# Altium footprint library 我的封装库.PcbLib: 90 footprints (part 6 of 6)
Each footprint in its own frame and in the unit in brackets; x right, y up, seen from the top. Pads: shape width x height; smd on the part's side, far side on the other; paste and mask are expansions set on the pad; w line width, h text height; cw(c..) or ccw(c..) is an arc to the next point about the centre after c.
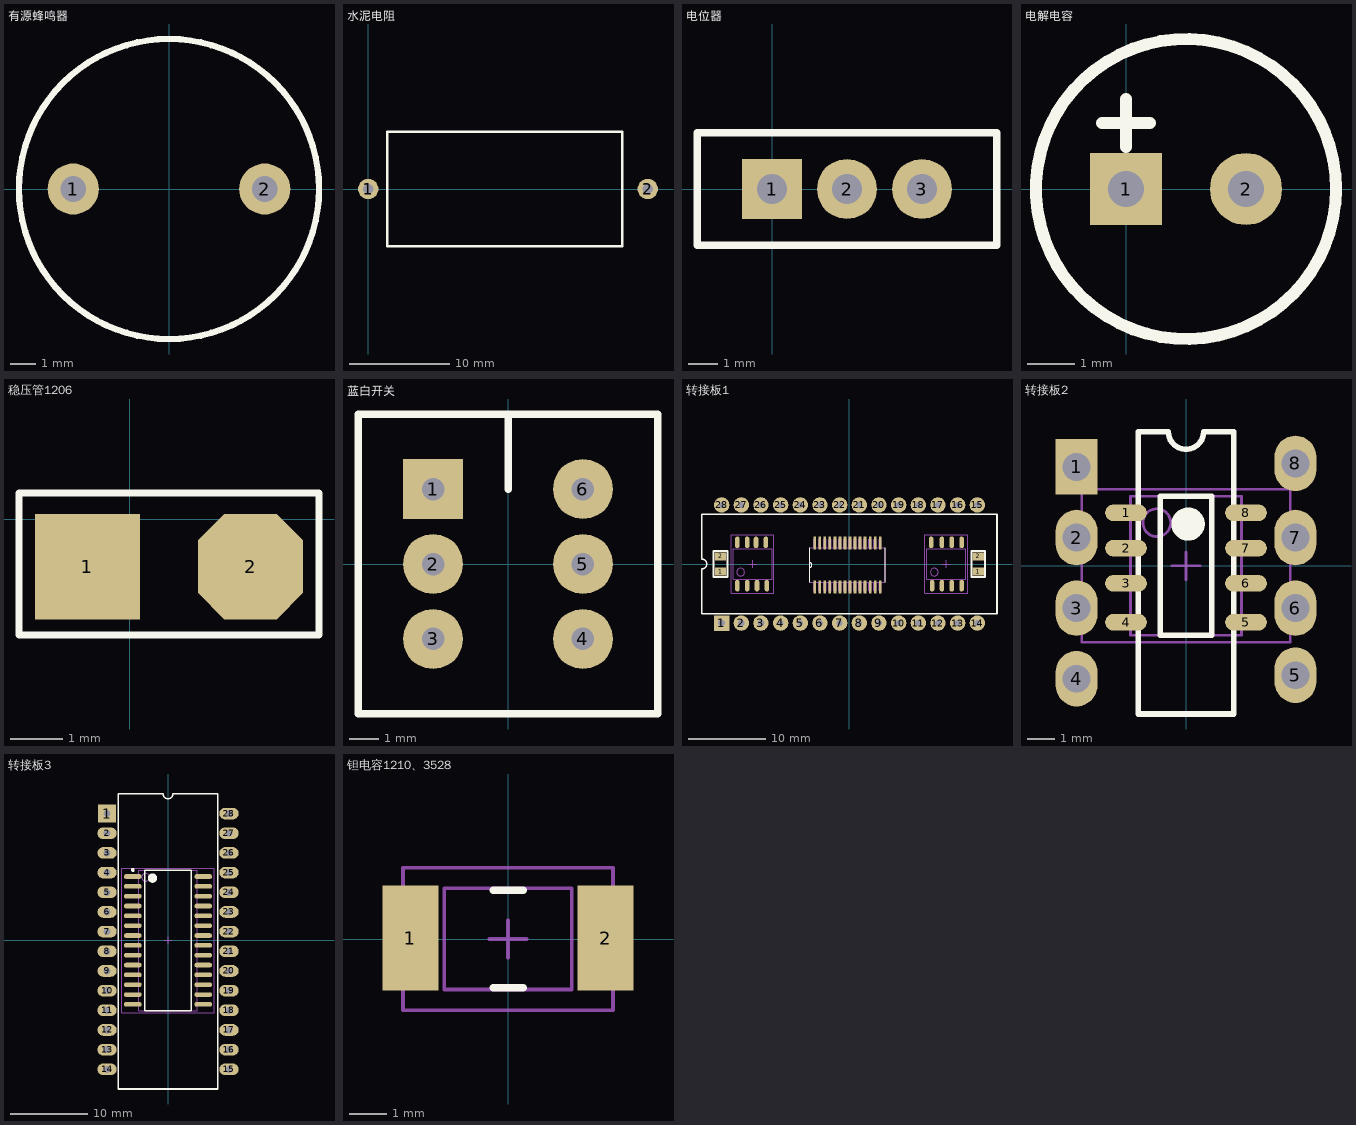
[diagram p5: the footprints below, top view; thin cyan lines are the x and y axes]

## 有源蜂鸣器 [mil]
pads (2):
  round 80 hole 40: 1(-150,0) 2(150,0)
Top Overlay:
  circle w10: c0,0 r235

## 水泥电阻 [mil]
pads (2):
  round 80 hole 40: 1(0,0) 2(1100,0)
Top Overlay:
  lines w10: 75,-225 1000,-225 1000,225 75,225 75,-225

## 电位器 [mil]
pads (3):
  rect 80x80 hole 40: 1(0,0)
  round 80 hole 40: 2(100,0) 3(200,0)
Top Overlay:
  lines w10: -100,-75 -100,75 300,75 300,-75 -100,-75

## 电解电容 [mil]
pads (2):
  rect 60x60 hole 30: 1(0,0)
  round 60 hole 30: 2(100,0)
Top Overlay:
  circle w10: c50,0 r125
  lines w10: -20,55 20,55 ; 0,35 0,75

## 稳压管1206 [mm]
pads (2):
  rect 2x2 smd: 1(-0.8,-0.9)
  oct 2x2 smd: 2(2.3,-0.9)
Top Overlay:
  lines w0.127: -2.1,-2.2 -2.1,0.5 3.6,0.5 3.6,-2.2 -2.1,-2.2

## 蓝白开关 [mil]
pads (6):
  rect 80x80 hole 30: 1(-100,100)
  round 80 hole 30: 2(-100,0) 3(-100,-100) 4(100,-100) 5(100,0) 6(100,100)
Top Overlay:
  lines w10: 0,100 0,200 ; -200,-200 -200,200 200,200 200,-200 -200,-200

## 转接板1 [mil]
pads (76):
  rect 57.09x41.34 smd: 1(-655,-38.39) 1(655,-38.39) 2(-655,38.39) 2(655,38.39)
  rect 78.74x78.74 hole 35.43: 1(-650,-300)
  oval 23.62x59.06 smd: 1(-570,-110) 1(420,-110) 2(-520,-110) 2(470,-110) 3(-470,-110) 3(520,-110) 4(-420,-110) 4(570,-110) 5(-425,110) 5(570,110) 6(-475,110) 6(520,110) 7(-520,110) 7(470,110) 8(-570,110) 8(415,110)
  rect 14x66 smd: 1(-176.34,-116) 2(-150.75,-116) 3(-125.16,-116) 4(-99.57,-116) 5(-73.98,-116) 6(-48.39,-116) 7(-22.8,-116) 8(2.8,-116) 9(28.39,-116) 10(53.98,-116) 11(79.57,-116) 12(105.16,-116) 13(130.75,-116) 14(156.34,-116) 15(156.34,106) 16(130.75,106) 17(105.16,106) 18(79.57,106) 19(53.98,106) 20(28.39,106) 21(2.8,106) 22(-22.8,106) 23(-48.39,106) 24(-73.98,106) 25(-99.57,106) 26(-125.16,106) 27(-150.75,106) 28(-176.34,106)
  round 78.74 hole 35.43: 2(-550,-300) 3(-450,-300)
  round 78.74 hole 30: 4(-350,-300) 5(-250,-300) 6(-150,-300) 7(-50,-300) 8(50,-300) 9(150,-300) 10(250,-300) 11(350,-300) 12(450,-300) 13(550,-300) 14(650,-300) 15(650,300) 16(550,300) 17(450,300) 18(350,300) 19(250,300) 20(150,300) 21(50,300) 22(-50,300) 23(-150,300) 24(-250,300) 25(-350,300) 26(-450,300) 27(-550,300) 28(-650,300)
Top Overlay:
  lines w6: -203,-93.5 -203,83.5 ; -203,-17 ccw(c-203,-5) -203,7 ; 183,-93.5 183,83.5
  lines w7.87: -750,-253.94 750,-253.94 750,253.94 -750,253.94 -750,25 cw(c-750,0) -750,-25 -750,-253.94
  lines w10: -690,-65 -620,-65 -620,65 -690,65 -690,-65 ; 620,-65 690,-65 690,65 620,65 620,-65
Mechanical 1:
  lines w0: -203,-17 ccw(c-203,-5) -203,7 ; -203,-93.5 183,-93.5 183,83.5 -203,83.5 -203,-93.5 ; -182.34,-135 -170.34,-135 -170.34,-93.5 -182.34,-93.5 -182.34,-135 ; -182.34,83.5 -182.34,125 -170.34,125 -170.34,83.5 -182.34,83.5 ; -156.75,-135 -144.75,-135 -144.75,-93.5 -156.75,-93.5 -156.75,-135 ; -156.75,83.5 -156.75,125 -144.75,125 -144.75,83.5 -156.75,83.5 ; -131.16,-135 -119.16,-135 -119.16,-93.5 -131.16,-93.5 -131.16,-135 ; -131.16,83.5 -131.16,125 -119.16,125 -119.16,83.5 -131.16,83.5 ; -105.57,-135 -93.57,-135 -93.57,-93.5 -105.57,-93.5 -105.57,-135 ; -105.57,83.5 -105.57,125 -93.57,125 -93.57,83.5 -105.57,83.5 ; -79.98,-135 -67.98,-135 -67.98,-93.5 -79.98,-93.5 -79.98,-135 ; -79.98,83.5 -79.98,125 -67.98,125 -67.98,83.5 -79.98,83.5 ; -54.39,-135 -42.39,-135 -42.39,-93.5 -54.39,-93.5 -54.39,-135 ; -54.39,83.5 -54.39,125 -42.39,125 -42.39,83.5 -54.39,83.5 ; -28.8,-135 -16.8,-135 -16.8,-93.5 -28.8,-93.5 -28.8,-135 ; -28.8,83.5 -28.8,125 -16.8,125 -16.8,83.5 -28.8,83.5 ; -3.2,-135 8.8,-135 8.8,-93.5 -3.2,-93.5 -3.2,-135 ; -3.2,83.5 -3.2,125 8.8,125 8.8,83.5 -3.2,83.5 ; 22.39,-135 34.39,-135 34.39,-93.5 22.39,-93.5 22.39,-135 ; 22.39,83.5 22.39,125 34.39,125 34.39,83.5 22.39,83.5 ; 47.98,-135 59.98,-135 59.98,-93.5 47.98,-93.5 47.98,-135 ; 47.98,83.5 47.98,125 59.98,125 59.98,83.5 47.98,83.5 ; 73.57,-135 85.57,-135 85.57,-93.5 73.57,-93.5 73.57,-135 ; 73.57,83.5 73.57,125 85.57,125 85.57,83.5 73.57,83.5 ; 99.16,-135 111.16,-135 111.16,-93.5 99.16,-93.5 99.16,-135 ; 99.16,83.5 99.16,125 111.16,125 111.16,83.5 99.16,83.5 ; 124.75,-135 136.75,-135 136.75,-93.5 124.75,-93.5 124.75,-135 ; 124.75,83.5 124.75,125 136.75,125 136.75,83.5 124.75,83.5 ; 150.34,-135 162.34,-135 162.34,-93.5 150.34,-93.5 150.34,-135 ; 150.34,83.5 150.34,125 162.34,125 162.34,83.5 150.34,83.5
Mechanical 13:
  circle w3.94: c431.1,-41.34 r19.68
  circle w3.94: c-553.15,-41.34 r19.68
  lines w3.94: -682.56,-43.31 -627.44,-43.31 ; -682.56,43.31 -627.44,43.31 ; 627.44,-43.31 682.56,-43.31 ; 627.44,43.31 682.56,43.31 ; -590.55,-78.74 -590.55,78.74 -393.7,78.74 -393.7,-78.74 -590.55,-78.74 ; 393.7,-78.74 393.7,78.74 590.55,78.74 590.55,-78.74 393.7,-78.74
Mechanical 15:
  lines w3.94: -511.81,0 -472.44,0 ; -492.13,-19.68 -492.13,19.69 ; 472.44,0 511.81,0 ; 492.13,-19.68 492.13,19.69 ; -600.39,-147.64 -600.39,147.64 -383.86,147.64 -383.86,-147.64 -600.39,-147.64 ; 383.86,-147.64 383.86,147.64 600.39,147.64 600.39,-147.64 383.86,-147.64
Drill Drawing:
  drawing of 166 lines, arcs and shapes, not listed
3D body: height 68.9, standoff 7.48, extent 393.7,-78.74 590.55,78.74
3D body: height 68.9, standoff 7.48, extent -590.55,-78.74 -393.7,78.74

## 转接板2 [mm]
pads (16):
  rect 1.5x2 hole 1: 1(-3.937,3.556)
  oval 1.5x0.6 smd: 1(-2.159,1.905) 2(-2.159,0.635) 3(-2.159,-0.635) 4(-2.159,-2.032) 5(2.159,-2.032) 6(2.159,-0.635) 7(2.159,0.635) 8(2.159,1.905)
  oval 1.5x2 hole 1: 2(-3.937,1.016) 3(-3.937,-1.524) 4(-3.937,-4.064) 5(3.937,-3.937) 6(3.937,-1.524) 7(3.937,1.016) 8(3.937,3.683)
Top Overlay:
  circle w0.6: c0.075,1.5 r0.3
  lines w0.2: -1.725,-5.334 -1.725,4.826 -0.635,4.826 ccw(c0,4.826) 0.635,4.826 1.725,4.826 1.725,-5.334 -1.725,-5.334 ; -0.925,-2.5 -0.925,2.5 0.925,2.5 0.925,-2.5 -0.925,-2.5
Mechanical 13:
  circle w0.1: c-1.05,1.55 r0.5
  lines w0.1: -2,-2.5 -2,2.5 2,2.5 2,-2.5 -2,-2.5
Mechanical 15:
  lines w0.1: -0.5,0 0.5,0 ; 0,-0.5 0,0.5 ; -3.75,-2.75 -3.75,2.75 3.75,2.75 3.75,-2.75 -3.75,-2.75
Drill Drawing:
  lines w0.254: -4.191,-3.683 -2.667,-2.159 -2.667,-2.032 ; -4.064,3.556 -3.81,3.556 ; -3.556,-1.397 -2.794,-0.635 ; -3.556,2.794 -3.429,2.794 -3.429,2.667 -2.54,1.778 ; -3.429,0.635 -2.667,0.635 ; 2.54,-2.032 2.54,-2.159 4.064,-3.683 ; 2.667,-0.635 3.556,-1.524 ; 2.667,0.635 3.429,0.635 ; 2.667,1.905 2.667,2.032 3.683,3.048
3D body: height 1.75, standoff 0.19, extent -2,-2.5 2,2.5

## 转接板3 [mm]
pads (56):
  rect 2.3x2.3 hole 0.9: 1(-7.874,16.383)
  oval 2.3x0.6 smd: 1(-4.55,8.255) 2(-4.55,6.985) 3(-4.55,5.715) 4(-4.55,4.445) 5(-4.55,3.175) 6(-4.55,1.905) 7(-4.55,0.635) 8(-4.55,-0.635) 9(-4.55,-1.905) 10(-4.55,-3.175) 11(-4.55,-4.445) 12(-4.55,-5.715) 13(-4.55,-6.985) 14(-4.55,-8.255) 15(4.55,-8.255) 16(4.55,-6.985) 17(4.55,-5.715) 18(4.55,-4.445) 19(4.55,-3.175) 20(4.55,-1.905) 21(4.55,-0.635) 22(4.55,0.635) 23(4.55,1.905) 24(4.55,3.175) 25(4.55,4.445) 26(4.55,5.715) 27(4.55,6.985) 28(4.55,8.255)
  oval 2.5x1.5 hole 0.9: 2(-7.874,13.843) 3(-7.874,11.303) 4(-7.874,8.763) 5(-7.874,6.223) 6(-7.874,3.683) 7(-7.874,1.143) 8(-7.874,-1.397) 9(-7.874,-3.937) 10(-7.874,-6.477) 11(-7.874,-9.017) 12(-7.874,-11.557) 13(-7.874,-14.097) 14(-7.874,-16.637) 15(7.874,-16.637) 16(7.874,-14.097) 17(7.874,-11.557) 18(7.874,-9.017) 19(7.874,-6.477) 20(7.874,-3.937) 21(7.874,-1.397) 22(7.874,1.143) 23(7.874,3.683) 24(7.874,6.223) 25(7.874,8.763) 26(7.874,11.303) 27(7.874,13.843) 28(7.874,16.383)
Top Overlay:
  circle w0.6: c-2,8.05 r0.3
  circle w0.25: c-4.55,9.105 r0.125
  lines w0.2: -6.45,-19.177 6.45,-19.177 6.45,18.923 0.635,18.923 cw(c0,18.923) -0.635,18.923 -6.45,18.923 -6.45,-19.177 ; -3,-9.05 3,-9.05 3,9.05 -3,9.05 -3,-9.05
Mechanical 13:
  circle w0.1: c-2.9,8.155 r0.5
  lines w0.1: -3.8,-9.055 3.8,-9.055 3.8,9.055 -3.8,9.055 -3.8,-9.055
Mechanical 15:
  lines w0.1: -0.5,0 0.5,0 ; 0,-0.5 0,0.5 ; -5.95,-9.3 5.95,-9.3 5.95,9.3 -5.95,9.3 -5.95,-9.3
Drill Drawing:
  lines w0.254: -7.874,-16.637 -4.572,-16.637 -4.445,-16.51 -4.445,-8.255 ; -7.874,-14.097 -9.779,-14.097 -9.779,-18.034 -2.159,-18.034 -2.159,-6.985 -4.064,-6.985 ; -7.874,-11.557 -10.414,-11.557 -10.668,-11.811 -10.668,-19.177 -0.762,-19.177 -0.762,-5.715 -4.064,-5.715 ; -7.874,-3.937 -5.842,-1.905 -5.461,-1.905 ; -7.874,0.635 -5.334,0.635 ; -7.874,6.223 -7.874,5.969 -5.08,3.175 ; -7.874,8.763 -6.096,8.763 -6.096,5.334 -5.207,4.445 ; -7.874,11.303 -10.414,11.303 -10.541,11.43 -10.541,19.431 -0.889,19.431 -0.889,5.715 -3.81,5.715 ; -7.874,13.843 -9.652,13.843 -9.652,18.415 -2.921,18.415 -2.921,6.985 -4.064,6.985 ; -7.874,16.383 -4.445,16.383 -4.445,8.382 ; -7.493,-9.017 -6.096,-7.62 -6.096,-5.334 -5.207,-4.445 ; -7.366,-6.096 -7.366,-5.461 -5.08,-3.175 ; -7.366,-0.762 -5.588,-0.762 ; -5.334,1.905 -7.112,3.683 ; 3.81,5.715 0.889,5.715 0.889,19.431 10.922,19.431 10.922,11.43 10.795,11.303 8.128,11.303 ; 3.81,6.985 2.921,6.985 2.921,8.255 2.921,18.415 9.906,18.415 9.906,13.843 7.874,13.843 ; 4.064,-5.715 1.016,-5.715 1.016,-19.05 1.143,-19.177 10.668,-19.177 10.668,-11.811 10.414,-11.557 7.874,-11.557 ; 4.445,-6.985 2.413,-6.985 2.413,-17.907 2.54,-18.034 9.779,-18.034 9.779,-14.097 7.874,-14.097 ; 4.572,-8.255 4.572,-16.51 4.699,-16.637 7.874,-16.637 ; 4.572,8.255 4.572,16.383 7.874,16.383 ; 4.826,-3.175 5.08,-3.175 8.001,-6.096 ; 5.08,3.175 7.874,5.969 7.874,6.223 ; 5.207,-1.905 5.842,-1.905 7.874,-3.937 ; 5.207,1.905 6.985,3.683 7.874,3.683 7.112,3.683 ; 5.334,4.572 6.096,5.334 6.096,8.763 7.874,8.763 ; 5.461,-4.445 6.096,-5.08 6.096,-7.239 7.874,-9.017 ; 5.461,-0.762 7.493,-0.762 ; 5.461,0.762 7.366,0.762 ; -7.874,3.683 -7.112,3.683 ; -7.874,3.683 -7.112,3.683 ; -7.874,3.683 -7.112,3.683
3D body: height 2.65, standoff 0, extent -3.8,-9.055 3.8,9.055

## 钽电容1210、3528 [mm]
pads (2):
  rect 1.5x2.8 smd: 1(-2.6,0.025) 2(2.6,0.025)
Top Overlay:
  lines w0.2: -0.4,-1.3 0.4,-1.3 ; -0.4,1.3 0.4,1.3
Mechanical 13:
  lines w0.1: -1.7,-1.35 1.7,-1.35 1.7,1.35 -1.7,1.35 -1.7,-1.35
Mechanical 15:
  lines w0.1: -0.5,0 0.5,0 ; 0,-0.5 0,0.5 ; -2.8,-1.9 2.8,-1.9 2.8,1.9 -2.8,1.9 -2.8,-1.9
3D body: height 1.5, standoff 0, extent -1.7,-1.35 1.7,1.35